# Altium footprint library Ahaltech BMS.PcbLib: 33 footprints (part 1 of 3)
Each footprint in its own frame and in the unit in brackets; x right, y up, seen from the top. Pads: shape width x height; smd on the part's side, far side on the other; paste and mask are expansions set on the pad; w line width, h text height; cw(c..) or ccw(c..) is an arc to the next point about the centre after c.
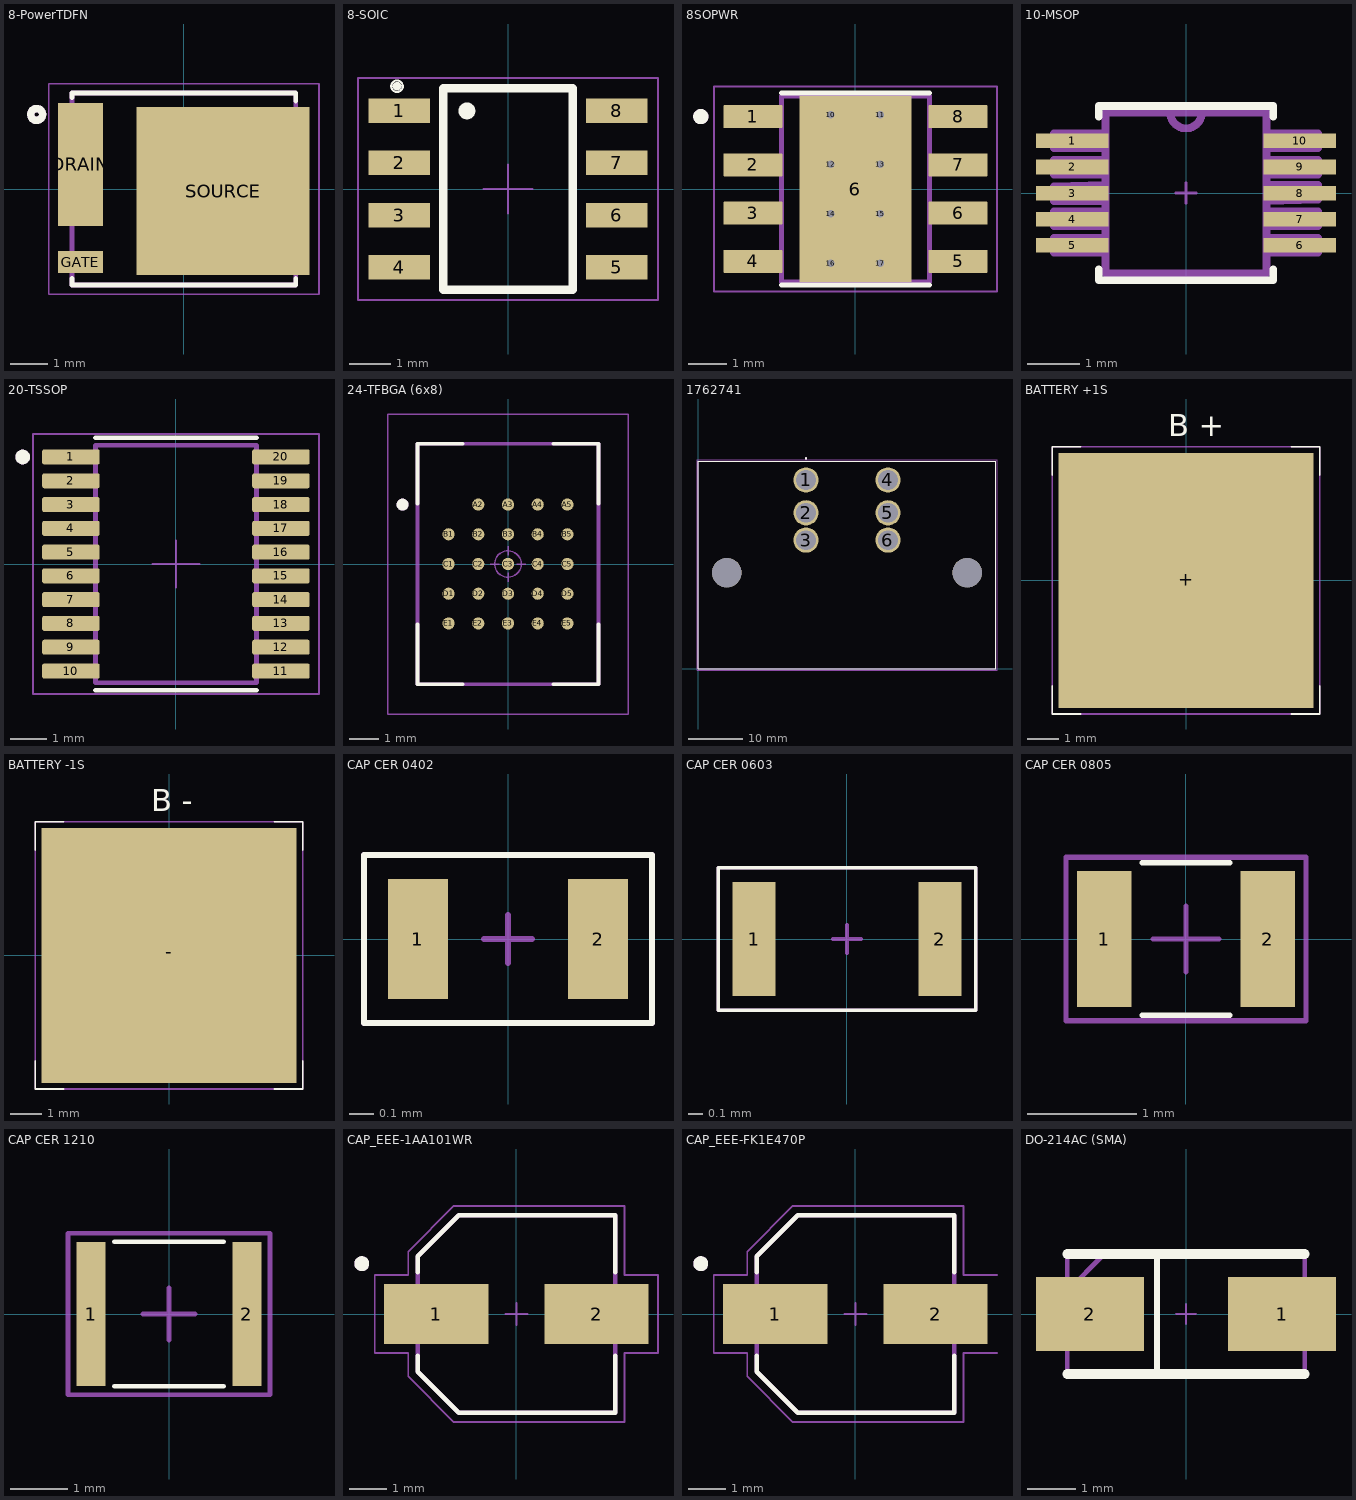
[diagram p0: the footprints below, top view; thin cyan lines are the x and y axes]

## 8-PowerTDFN [mm]
pads (3):
  rect 1.2x3.3 smd paste-3 mask+0: DRAIN(-2.775,0.66)
  rect 1.2x0.6 smd paste-2 mask-0.05: GATE(-2.775,-1.96)
  rect 4.65x4.51 smd paste-3 mask+0: SOURCE(1.05,-0.055)
Top Overlay:
  circle w0.2: c-3.95,2 r0.158
  lines w0.127: -3,-2.4 -3,-2.575 3,-2.575 3,-2.4 ; -3,2.45 -3,2.575 3,2.575 3,2.36
Top Paste:
  region: 3.27,-2.212 2.523,-2.212 2.523,-1.71 3.27,-1.71
  region: 3.27,-0.943 2.529,-0.943 2.529,-0.44 3.27,-0.44
  region: 3.27,0.331 2.53,0.331 2.53,0.83 3.27,0.83
  region: 3.27,1.602 2.522,1.602 2.522,2.1 3.27,2.1
  region: 2.24,-1.661 0.743,-1.661 0.743,-0.155 2.24,-0.155
  region: 0.54,-1.662 -0.964,-1.662 -0.964,-0.155 0.54,-0.155
  region: 2.24,0.045 0.742,0.045 0.742,1.545 2.24,1.545
  region: 0.54,0.045 -0.963,0.045 -0.963,1.545 0.54,1.545
  region: -2.27,0.211 -2.73,0.211 -2.73,1.11 -2.27,1.11
  region: -2.27,1.316 -2.732,1.316 -2.732,2.21 -2.27,2.21
  region: -2.27,-0.891 -2.724,-0.891 -2.724,0.01 -2.27,0.01
  region: -2.92,-0.893 -3.279,-0.893 -3.279,-0.49 -2.92,-0.49
  region: -2.92,0.381 -3.277,0.381 -3.277,0.78 -2.92,0.78
  region: -2.92,1.657 -3.284,1.657 -3.284,2.05 -2.92,2.05
  region: -2.92,-2.167 -3.28,-2.167 -3.28,-1.76 -2.92,-1.76
  region: -2.27,-2.163 -2.724,-2.163 -2.724,-1.76 -2.27,-1.76
Top Solder:
  region: -2.225,-0.94 -3.325,-0.94 -3.325,-0.44 -2.825,-0.44 -2.825,0.33 -3.325,0.33 -3.325,0.83 -2.825,0.83 -2.825,1.6 -3.325,1.6 -3.325,2.1 -2.825,2.1 -2.825,2.26 -2.225,2.26
  region: 3.325,1.55 2.525,1.55 2.525,0.88 3.325,0.88 3.325,0.28 2.525,0.28 2.525,-0.39 3.325,-0.39 3.325,-0.99 2.525,-0.99 2.525,-1.66 3.325,-1.66 3.325,-2.26 -1.225,-2.26 -1.225,2.15 3.325,2.15
Top Component Center:
  lines w0.05: -0.8,0 0,0 ; 0,-0.8 0,0 ; 0,0.8 0,0 ; 0.8,0 0,0 ; -3.625,-2.825 3.625,-2.825 3.625,2.825 -3.625,2.825 -3.625,-2.825
Top Designator:
  circle w0.2: c-3.95,2 r0.158
  lines w0.127: -3,-2.575 3,-2.575 3,2.575 -3,2.575 -3,-2.575
  text ".Designator" at -0.8,-0.267 h0.7
3D body "step_temp.STEP": height 1.2, standoff 0, extent -3.025,-2.608 3,2.608

## 8-SOIC [mm]
pads (8):
  rect 1.5x0.6 smd: 1(-2.65,1.905) 2(-2.65,0.635) 3(-2.65,-0.635) 4(-2.65,-1.905) 5(2.65,-1.905) 6(2.65,-0.635) 7(2.65,0.635) 8(2.65,1.905)
Top Overlay:
  drawing of 7 lines, arcs and shapes, not listed
Top Component Center:
  lines w0.05: -0.6,0 0,0 ; 0,-0.6 0,0 ; 0,0.6 0,0 ; 0.6,0 0,0 ; -3.65,-2.7 3.65,-2.7 3.65,2.7 -3.65,2.7 -3.65,-2.7
Top Designator:
  lines w0.05: -3.65,-2.7 3.65,-2.7 3.65,2.7 -3.65,2.7 -3.65,-2.7
  text ".Designator" at 0.067,-0.5 h0.7
3D body "step_temp.STEP": height 1.75, standoff 0, extent -3,-2.45 3,2.45

## 8SOPWR [mm]
pads (17):
  rrect5% 1.55x0.6 smd mask+0: 1(-2.7,1.905) 2(-2.7,0.635) 3(-2.7,-0.635) 4(-2.7,-1.905) 5(2.7,-1.905) 6(2.7,-0.635) 7(2.7,0.635) 8(2.7,1.905)
  rect 2.95x4.9 smd paste-3 mask+0: 6(0,0)
  round 0.3 hole 0.2: 10(-0.65,1.95) 11(0.65,1.95) 12(-0.65,0.65) 13(0.65,0.65) 14(-0.65,-0.65) 15(0.65,-0.65) 16(-0.65,-1.95) 17(0.65,-1.95)
Top Overlay:
  circle w0.2: c-4.07,1.905 r0.1
  lines w0.127: -1.95,-2.525 1.95,-2.525 ; -1.95,2.525 1.95,2.525
Top Paste:
  region: 1.355,-1.7 -1.355,-1.7 -1.355,1.7 1.355,1.7
Top Solder:
  drawing of 9 lines, arcs and shapes, not listed
Top Component Center:
  lines w0.05: -0.635,0 0,0 ; 0,-0.635 0,0 ; 0,0.635 0,0 ; 0.635,0 0,0 ; -3.725,-2.7 -3.725,2.7 3.725,2.7 3.725,-2.7 -3.725,-2.7
Top Designator:
  circle w0.2: c-4.07,1.905 r0.1
  lines w0.127: -1.95,-2.45 -1.95,2.45 1.95,2.45 1.95,-2.45 -1.95,-2.45
  text ".Designator" at -0.485,-0.285 h0.6
3D body "step_temp.STEP": height 1.7, standoff 0, extent -3,-2.45 3,2.45

## 10-MSOP [mil]
pads (10):
  rect 55x11 smd: 1(-86,39.4) 2(-86,19.7) 3(-86,0) 4(-86,-19.7) 5(-86,-39.4) 6(86,-39.4) 7(86,-19.7) 8(86,0) 9(86,19.7) 10(86,39.4)
Top Overlay:
  lines w6: -66,-58 -66,-66 66,-66 66,-58 ; -66,58 -66,66 66,66 66,58
Top Component Center:
  lines w1.97: -7.87,0 0,0 ; 0,-7.87 0,0 ; 0,7.87 0,0 ; 7.87,0 0,0
  lines w6: -12,61 ccw(c0,61) 12,61 ; -12,61 -61,61 -61,-61 61,-61 61,61 12,61 ; -12,61 12,61 ; -100,-45 -100,-34 -61,-34 -61,-45 -100,-45 ; -100,-25 -61,-25 -61,-14 -100,-14 -100,-25 ; -100,-6 -61,-6 -61,6 -100,5 -100,-6 ; -100,14 -61,14 -61,25 -100,25 -100,14 ; -100,34 -61,34 -61,45 -100,45 -100,34 ; 61,-45 100,-45 100,-34 61,-34 61,-45 ; 61,-25 61,-14 100,-14 100,-25 61,-25 ; 61,-6 61,6 100,6 100,-5 61,-6 ; 61,14 100,14 100,25 61,25 61,14 ; 61,34 100,34 100,45 61,45 61,34
Top Designator:
  lines w1.97: -7.87,0 0,0 ; 0,-7.87 0,0 ; 0,7.87 0,0 ; 7.87,0 0,0
  lines w6: -12,61 ccw(c0,61) 12,61 ; -12,61 -61,61 -61,-61 61,-61 61,61 12,61 ; -12,61 12,61 ; -100,-45 -100,-34 -61,-34 -61,-45 -100,-45 ; -100,-25 -100,-14 -61,-14 -61,-25 -100,-25 ; -100,-6 -100,5 -61,6 -61,-6 -100,-6 ; -100,14 -100,25 -61,25 -61,14 -100,14 ; -100,34 -100,45 -61,45 -61,34 -100,34 ; 61,-45 100,-45 100,-34 61,-34 61,-45 ; 61,-25 100,-25 100,-14 61,-14 61,-25 ; 61,-6 100,-5 100,6 61,6 61,-6 ; 61,14 100,14 100,25 61,25 61,14 ; 61,34 100,34 100,45 61,45 61,34
  text ".Designator" at 4.59,21.65 h19.68
3D body "step_temp.STEP": height 43.31, standoff 0, extent -96.46,-59.06 96.46,59.06

## 20-TSSOP [mm]
pads (20):
  rrect25% 1.57x0.41 smd: 1(-2.87,2.925) 2(-2.87,2.275) 3(-2.87,1.625) 4(-2.87,0.975) 5(-2.87,0.325) 6(-2.87,-0.325) 7(-2.87,-0.975) 8(-2.87,-1.625) 9(-2.87,-2.275) 10(-2.87,-2.925) 11(2.87,-2.925) 12(2.87,-2.275) 13(2.87,-1.625) 14(2.87,-0.975) 15(2.87,-0.325) 16(2.87,0.325) 17(2.87,0.975) 18(2.87,1.625) 19(2.87,2.275) 20(2.87,2.925)
Top Overlay:
  circle w0.2: c-4.19,2.925 r0.1
  lines w0.127: -2.2,-3.45 2.2,-3.45 ; -2.2,3.45 2.2,3.45
Top Component Center:
  lines w0.05: -0.65,0 0,0 ; 0,-0.65 0,0 ; 0,0.65 0,0 ; 0.65,0 0,0 ; -3.91,-3.55 -3.91,3.55 3.91,3.55 3.91,-3.55 -3.91,-3.55
Top Designator:
  circle w0.2: c-4.19,2.925 r0.1
  lines w0.127: -2.2,-3.25 -2.2,3.25 2.2,3.25 2.2,-3.25 -2.2,-3.25
  text ".Designator" at -0.133,-0.4 h0.7
3D body "step_temp.STEP": height 1.2, standoff 0, extent -3.2,-3.25 3.2,3.25

## 24-TFBGA (6x8) [mm]
pads (24):
  round 0.41 smd: A2(-1,2) A3(0,2) A4(1,2) A5(2,2) B1(-2,1) B2(-1,1) B3(0,1) B4(1,1) B5(2,1) C1(-2,0) C2(-1,0) C3(0,0) C4(1,0) C5(2,0) D1(-2,-1) D2(-1,-1) D3(0,-1) D4(1,-1) D5(2,-1) E1(-2,-2) E2(-1,-2) E3(0,-2) E4(1,-2) E5(2,-2)
Top Overlay:
  circle w0.2: c-3.55,2 r0.1
  lines w0.127: -3.05,-2.025 -3.05,-4.05 -1.525,-4.05 ; -3.05,2.025 -3.05,4.05 -1.525,4.05 ; 1.525,-4.05 3.05,-4.05 3.05,-2.025 ; 1.525,4.05 3.05,4.05 3.05,2.025
Top Component Center:
  circle w0.05: c0,0 r0.447
  lines w0.05: -0.6,0 -0.3,0 ; 0,-0.6 0,-0.3 ; 0,0.3 0,0.6 ; 0.3,0 0.6,0 ; -4.05,-5.05 -4.05,5.05 4.05,5.05 4.05,-5.05 -4.05,-5.05
Top Designator:
  circle w0.2: c-3.55,2 r0.1
  lines w0.127: -3.05,-4.05 -3.05,4.05 3.05,4.05 3.05,-4.05 -3.05,-4.05
  text ".Designator" at -0.2,2.733 h0.7
3D body "IS66WVH8M8ALL-166B1LI.STEP": height 1.2, standoff 0, extent -3,-4 3,4

## 1762741 [mm]
pads (8):
  round 4.616 hole 3.6 mask+0.05: 1(19.7,34.55) 2(19.7,28.55) 3(19.7,23.55) 4(34.7,34.55) 5(34.7,28.55) 6(34.7,23.55)
  round 5.4 hole 5.4 unplated: ""(5.2,17.6) ""(49.2,17.6)
Top Overlay:
  circle w0.2: c19.7,38.5 r0.1
  lines w0.127: 0,0 0,38 54.4,38 54.4,0 0,0
Top Component Center:
  lines w0.05: -0.25,-0.25 -0.25,38.25 54.65,38.25 54.65,-0.25 -0.25,-0.25
Top Designator:
  circle w0.2: c19.7,38.5 r0.1
  lines w0.127: 0,0 0,38 54.4,38 54.4,0 0,0
  text ".Designator" at 23.4,8.016 h5
3D body "1762741.stp": height 28.53, standoff -4.6, extent 0.21,0.05 54.61,38.05

## BATTERY +1S [mm]
pads (1):
  rect 8x8 smd mask+0.08: +(0,0)
Top Overlay:
  lines w0.05: -4.191,-3.302 -4.191,-4.191 -3.302,-4.191 ; -4.191,3.302 -4.191,4.191 -3.302,4.191 ; 3.302,-4.191 4.191,-4.191 4.191,-3.302 ; 3.302,4.191 4.191,4.191 4.191,3.302
  text "B +" at -0.562,4.518 h0.7
Top Component Center:
  lines w0.05: -4.191,-4.191 4.191,-4.191 4.191,4.191 -4.191,4.191 -4.191,-4.191
Top Designator:
  lines w0.05: -4.191,-4.191 4.191,-4.191 4.191,4.191 -4.191,4.191 -4.191,-4.191

## BATTERY -1S [mm]
pads (1):
  rect 8x8 smd mask+0.08: -(0,0)
Top Overlay:
  lines w0.05: -4.191,-3.302 -4.191,-4.191 -3.302,-4.191 ; -4.191,3.302 -4.191,4.191 -3.302,4.191 ; 3.302,-4.191 4.191,-4.191 4.191,-3.302 ; 3.302,4.191 4.191,4.191 4.191,3.302
  text "B -" at -0.562,4.518 h0.7
Top Component Center:
  lines w0.05: -4.191,-4.191 -4.191,4.191 4.191,4.191 4.191,-4.191 -4.191,-4.191
Top Designator:
  lines w0.05: -4.191,-4.191 -4.191,4.191 4.191,4.191 4.191,-4.191 -4.191,-4.191

## CAP CER 0402 [mm]
pads (2):
  rect 0.25x0.5 smd mask+0.08: 1(-0.375,0) 2(0.375,0)
Top Overlay:
  lines w0.025: -0.6,-0.35 -0.6,0.35 -0.15,0.35 0.6,0.35 0.6,-0.35 -0.6,-0.35
Top Component Center:
  lines w0.025: -0.1,0 0,0 ; 0,-0.1 0,0 ; 0,0.1 0,0 ; 0.1,0 0,0 ; -0.6,-0.35 0.6,-0.35 0.6,0.35 -0.25,0.35 -0.6,0.35 -0.6,-0.35
Top Designator:
  lines w0.025: -0.6,-0.35 0.6,-0.35 0.6,0.35 -0.1,0.35 -0.6,0.35 -0.6,-0.35
  text ".Designator" at 0.042,-0.075 h0.1
3D body "MLCC-0402-1005.step": height 0.5, standoff 0, extent -0.5,-0.25 0.5,0.25

## CAP CER 0603 [mm]
pads (2):
  rect 0.3x0.8 smd mask+0.08: 1(-0.65,0) 2(0.65,0)
Top Overlay:
  lines w0.025: -0.9,-0.5 0.9,-0.5 0.9,0.5 0.2,0.5 -0.9,0.5 -0.9,-0.5
Top Component Center:
  lines w0.025: -0.1,0 0,0 ; 0,-0.1 0,0 ; 0,0.1 0,0 ; 0.1,0 0,0 ; -0.9,-0.5 -0.9,0.5 -0.5,0.5 0.9,0.5 0.9,-0.5 -0.9,-0.5
Top Designator:
  lines w0.025: -0.9,-0.5 -0.9,0.5 -0.2,0.5 0.9,0.5 0.9,-0.5 -0.9,-0.5
  text ".Designator" at -0.017,-0.15 h0.2
3D body "MLCC-0603-1608.step": height 0.8, standoff 0, extent -0.8,-0.4 0.8,0.4

## CAP CER 0805 [mm]
pads (2):
  rect 0.5x1.25 smd mask+0.08: 1(-0.75,0) 2(0.75,0)
Top Overlay:
  lines w0.05: -0.4,-0.7 0.4,-0.7 ; -0.4,0.7 0.4,0.7
Top Component Center:
  lines w0.05: -0.3,0 0,0 ; 0,-0.3 0,0 ; 0,0.3 0,0 ; 0.3,0 0,0 ; -1.1,-0.75 -1.1,0.75 -0.55,0.75 1.1,0.75 1.1,-0.75 -1.1,-0.75
Top Designator:
  lines w0.05: -1.1,-0.75 1.1,-0.75 1.1,0.75 -0.4,0.75 -1.1,0.75 -1.1,-0.75
  text ".Designator" at 0.03,-0.23 h0.3
3D body "MLCC-0805-2012.step": height 1.23, standoff -0.02, extent -1,-0.625 1,0.625

## CAP CER 1210 [mm]
pads (2):
  rect 0.5x2.5 smd mask+0.08: 1(-1.35,0) 2(1.35,0)
Top Overlay:
  lines w0.08: -0.95,-1.25 0.95,-1.25 ; -0.95,1.25 0.95,1.25
Top Component Center:
  lines w0.08: -0.45,0 0,0 ; 0,-0.45 0,0 ; 0,0.45 0,0 ; 0.45,0 0,0 ; -1.75,-1.4 1.75,-1.4 1.75,1.4 -1.3,1.4 -1.75,1.4 -1.75,-1.4
Top Designator:
  lines w0.08: -1.75,-1.4 -1.75,1.4 0.45,1.4 1.75,1.4 1.75,-1.4 -1.75,-1.4
  text ".Designator" at 0.033,-0.35 h0.5
3D body "MLCC-1210-3225.step": height 2.5, standoff 0, extent -1.6,-1.25 1.6,1.25

## CAP_EEE-1AA101WR [mm]
pads (2):
  rect 2.8x1.6 smd: 1(-2.15,0) 2(2.15,0)
Top Overlay:
  circle w0.2: c-4.15,1.35 r0.1
  lines w0.127: -2.65,-1.12 -2.65,-1.55 -1.55,-2.65 2.65,-2.65 2.65,-1.12 ; -2.65,1.12 -2.65,1.55 -1.55,2.65 2.65,2.65 2.65,1.12
Top Component Center:
  lines w0.05: 0.3,0 -0.3,0 0,0 ; 0,0 0,0.3 0,0 ; 0,0 0,-0.3 0,0 ; -3.8,-1.05 -3.8,1.05 -2.9,1.05 -2.9,1.675 -1.675,2.9 2.9,2.9 2.9,1.05 3.8,1.05 3.8,-1.05 2.9,-1.05 2.9,-2.9 -1.675,-2.9 -2.9,-1.675 -2.9,-1.05 -3.8,-1.05
Top Designator:
  circle w0.2: c-4.15,1.35 r0.1
  lines w0.05: -0.3,0 0,0 ; 0,0.3 0,0 ; 0,0 0.3,0 0,0 ; 0,0 0,-0.3 0,0
  lines w0.127: -2.65,-1.55 -2.65,1.55 -1.55,2.65 2.65,2.65 2.65,-2.65 -1.55,-2.65 -2.65,-1.55
  text ".Designator" at 0.267,-0.5 h0.7
3D body "EEE-1AA101WR.STEP": height 5.8, standoff 0, extent -3,-2.65 3,2.65

## CAP_EEE-FK1E470P [mm]
pads (2):
  rect 2.8x1.6 smd: 1(-2.15,0) 2(2.15,0)
Top Overlay:
  circle w0.2: c-4.15,1.35 r0.1
  lines w0.127: -2.65,-1.12 -2.65,-1.55 -1.55,-2.65 2.65,-2.65 2.65,-1.12 ; -2.65,1.12 -2.65,1.55 -1.55,2.65 2.65,2.65 2.65,1.12
Top Component Center:
  lines w0.05: 0.3,0 -0.3,0 0,0 ; 3.8,-1.05 2.9,-1.05 2.9,-2.9 -1.675,-2.9 -2.9,-1.675 -2.9,-1.05 -3.8,-1.05 -3.8,1.05 -2.9,1.05 -2.9,1.675 -1.675,2.9 2.9,2.9 2.9,1.05 3.8,1.05 ; 0,0 0,-0.3 0,0 ; 0,0 0,0.3 0,0
Top Designator:
  circle w0.2: c-4.15,1.35 r0.1
  lines w0.05: -0.3,0 0,0 ; 0,0.3 0,0 ; 0,0 0.3,0 0,0 ; 0,0 0,-0.3 0,0
  lines w0.127: -2.65,-1.55 -1.55,-2.65 2.65,-2.65 2.65,2.65 -1.55,2.65 -2.65,1.55 -2.65,-1.55
  text ".Designator" at 0.267,-0.5 h0.7
3D body "EEE-FK1H100UR.STEP": height 5.8, standoff 0, extent -3,-2.65 3,2.65

## DO-214AC (SMA) [mm]
pads (2):
  rect 2.25x1.55 smd: 1(2,0) 2(-2,0)
Top Overlay:
  lines w0.127: -0.6,-1.2 -0.6,1.2
  lines w0.2: -2.475,-1.25 2.475,-1.25 ; -2.475,1.25 2.475,1.25
Top Component Center:
  lines w0.05: -0.2,0 0,0 ; 0,-0.2 0,0 ; 0.2,0 0,0 ; 0,0 0,0.2 0,0
  lines w0.1: -2.475,-1.25 -2.475,1.25 2.475,1.25 2.475,-1.25 -2.475,-1.25
Top Designator:
  lines w0.05: -0.2,0 0,0 ; 0,-0.2 0,0 ; 0.2,0 0,0 ; 0,0 0,0.2 0,0
  lines w0.1: -2.475,0.475 -1.7,1.25 ; -2.475,-1.25 -2.475,1.25 2.475,1.25 2.475,-1.25 -2.475,-1.25
  text ".Designator" at 0.183,-0.45 h0.5
3D body "step_temp.STEP": height 2.2, standoff 0, extent -2.475,-1.25 2.475,1.25